# Altium footprint library Derogarian_Library.PcbLib: 94 footprints (part 2 of 6)
Each footprint in its own frame and in the unit in brackets; x right, y up, seen from the top. Pads: shape width x height; smd on the part's side, far side on the other; paste and mask are expansions set on the pad; w line width, h text height; cw(c..) or ccw(c..) is an arc to the next point about the centre after c.
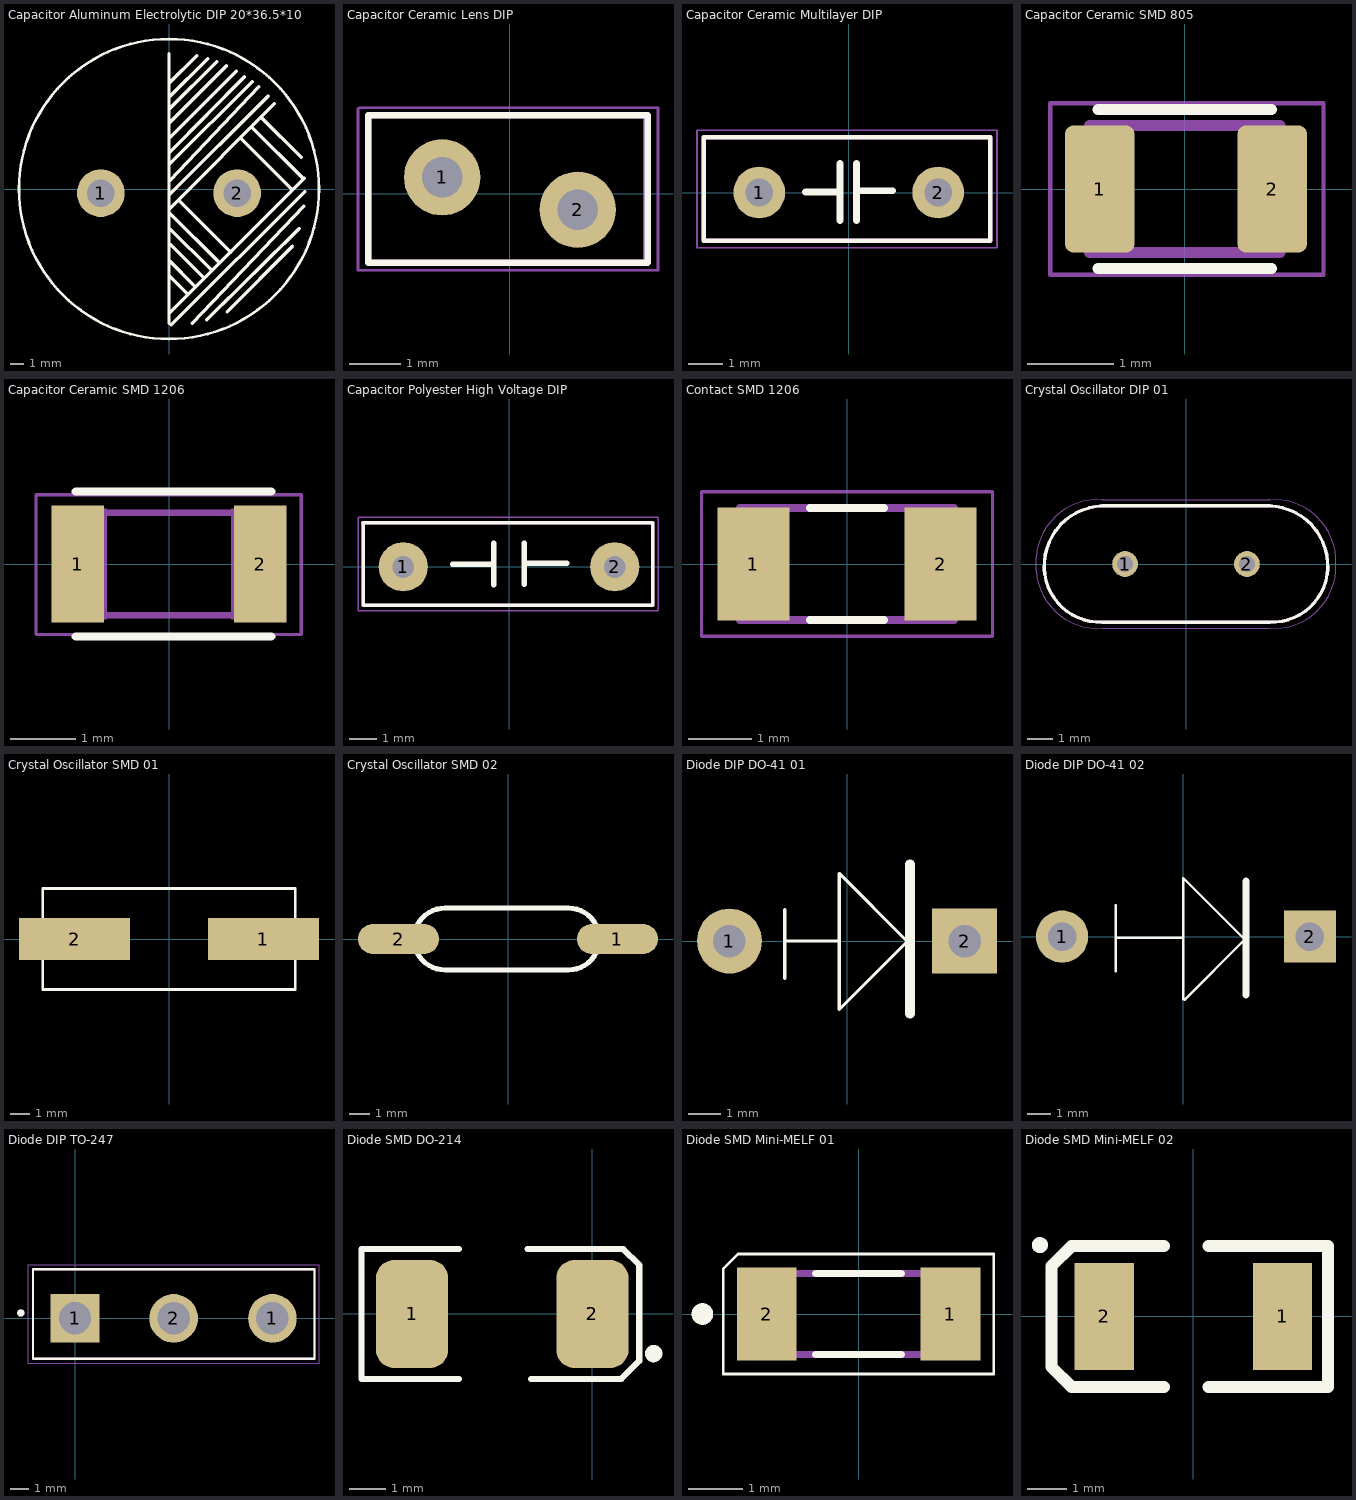
[diagram p1: the footprints below, top view; thin cyan lines are the x and y axes]

## Capacitor Aluminum Electrolytic DIP 20*36.5*10 [mm]
height 12
pads (2):
  round 3.5 hole 2: 1(-5,-0.305) 2(5,-0.305)
Top Overlay:
  circle w0.2: c0,0 r11
  lines w0.25: 0,-5.232 1.858,-7.083 ; 0,4.826 4.216,9.042 ; 0,5.842 3.492,9.335 ; 0,6.731 2.832,9.563 ; 0,7.747 2.032,9.779 ; 0.025,-9.119 9.931,0.787 ; 0.025,-6.375 1.375,-7.719 ; 0.025,-2.87 3.105,-5.937 ; 0.025,-0.432 7.277,6.82 ; 0.025,3.708 4.94,8.623 ; 0.051,-1.778 3.678,-5.391 ; 0.052,0.613 6.581,7.491 ; 0.064,1.841 6.096,7.874 ; 0.063,2.706 5.538,8.229 ; 0.076,-4.064 2.507,-6.485 ; 0.079,-1.425 7.722,6.248 ; 0.165,-9.97 9.944,-0.191 ; 0.813,-0.94 4.516,-4.628 ; 1.716,-9.844 9.881,-1.27 ; 2.763,-9.595 9.55,-2.896 ; 4.267,-9.017 9.059,-4.182 ; 5.258,3.708 9.05,-0.069 ; 6.071,4.521 9.875,0.732 ; 6.807,5.207 9.696,2.33
  lines w0.254: 0,-9.83 0,9.931 ; 0,6.909 0,7.544
3D body "User Library-CAPAER_D200_L350_P100_W010X030.STEP": height 2, standoff -36.01, extent -9.847,-10.33 10.163,9.67

## Capacitor Ceramic Lens DIP [mm]
pads (2):
  round 1.5 hole 0.8: 1(-1.333,0.318) 2(1.333,-0.318)
Top Overlay:
  lines w0.127: -2.787,1.543 -2.787,-1.359 2.706,-1.359 2.706,1.537 -2.781,1.537
Mechanical 13:
  lines w0.127: -2.787,-1.359 2.68,-1.359 2.68,1.537 -2.787,1.537 -2.787,-1.359
Mechanical 15:
  lines w0.05: -2.987,1.664 -2.987,-1.511 2.909,-1.511 2.909,1.69 -2.957,1.688
3D body "User Library-Cer-Cap2 (3_5x1_5).STEP": height 4.5, standoff -2, extent -1.66,-0.853 1.84,0.648

## Capacitor Ceramic Multilayer DIP [mm]
pads (2):
  round 1.5 hole 0.8: 1(-2.594,0) 2(2.594,0)
Top Overlay:
  lines w0.127: -4.198,-1.398 -4.198,1.602 4.094,1.602 ; -4.194,-1.398 4.094,-1.398 ; 4.097,-1.398 4.097,1.602
  lines w0.2: -1.254,0.013 -0.254,0.013 ; -0.254,-0.813 -0.254,0.838 ; 0.229,-0.813 0.229,0.838 ; 0.27,0.051 1.27,0.051
Mechanical 13:
  lines w0.127: 4.094,-1.398 -4.198,-1.398 -4.198,1.596 -4.194,1.6 4.094,1.6 ; 4.097,-1.398 4.097,1.6
Mechanical 15:
  lines w0.05: -4.398,1.802 -4.398,-1.598 4.29,-1.598 ; -4.397,1.802 4.29,1.803 ; 4.297,-1.598 4.297,1.802
3D body "c322c104k5r5ta.stp": height 7.31, standoff -6.29, extent -2.67,-1.51 2.92,1.675

## Capacitor Ceramic SMD 805 [mm]
pads (2):
  rrect25% 0.8x1.47 smd: 1(-0.98,0) 2(1.01,0)
Top Overlay:
  lines w0.127: -1,-0.915 1,-0.915 ; -1,0.915 1,0.915
Mechanical 13:
  lines w0: -0.356,-0.737 0.356,-0.737
  lines w0.127: -1.1,-0.73 1.1,-0.73 1.1,0.73 -1.1,0.73 -1.1,-0.73
Mechanical 15:
  lines w0.05: -1.55,-0.99 1.6,-0.99 1.6,0.99 -1.55,0.99 -1.55,-0.99
3D body "C0805C102K1RACTU.STEP": height 1.23, standoff -0.04, extent -0.94,-0.686 1.092,0.711

## Capacitor Ceramic SMD 1206 [mm]
pads (2):
  rect 0.8x1.8 smd: 1(-1.4,0) 2(1.4,0)
Top Overlay:
  lines w0.127: -1.43,-1.11 1.57,-1.11 ; -1.43,1.11 1.57,1.11
Mechanical 13:
  region: 1.702,-0.849 0.952,-0.849 0.952,0.851 1.702,0.851
  region: -0.952,-0.851 -1.702,-0.851 -1.702,0.849 -0.952,0.849
  lines w0.102: -0.965,-0.787 0.965,-0.787 ; -0.965,0.787 0.965,0.787
Mechanical 15:
  lines w0.051: -2.04,-1.08 -2.04,1.06 2.03,1.06 2.03,-1.08 -2.04,-1.08
3D body "c1206c101j5gactu.stp": height 0.87, standoff -0.01, extent -1.7,-0.9 1.7,0.9

## Capacitor Polyester High Voltage DIP [mm]
pads (2):
  round 1.8 hole 0.8: 1(-3.861,0) 2(3.861,0)
Top Overlay:
  lines w0.127: -5.333,1.602 5.238,1.602 ; -5.315,1.602 -5.315,-1.398 5.238,-1.398 ; 5.241,-1.398 5.241,1.602
  lines w0.2: -2.059,0.102 -0.559,0.102 ; -0.559,-0.648 -0.559,0.852 ; 0.559,-0.636 0.559,0.864 ; 0.608,0.127 2.108,0.127
Mechanical 13:
  lines w0.127: -5.315,-1.398 -5.315,1.596 -5.31,1.6 ; -5.307,-1.398 5.238,-1.398 ; -5.282,1.6 5.238,1.6 ; 5.241,-1.398 5.241,1.6
Mechanical 15:
  lines w0.05: -5.515,-1.598 -5.515,1.802 ; -5.51,-1.598 5.434,-1.598 ; -5.485,1.801 5.434,1.803 ; 5.441,-1.598 5.441,1.802
3D body "User Library-D6x7_5.STEP": height 9, standoff -2, extent -4.049,-1.578 4.051,1.422

## Contact SMD 1206 [mm]
pads (2):
  rect 1.13x1.77 smd: 1(-1.47,0) 2(1.47,0)
Top Overlay:
  lines w0.127: -0.58,-0.88 0.58,-0.88 ; -0.58,0.88 0.58,0.88
Mechanical 13:
  lines w0.127: -1.68,-0.88 1.68,-0.88 1.68,0.88 -1.68,0.88 -1.68,-0.88
Mechanical 15:
  lines w0.05: -2.285,-1.135 2.285,-1.135 2.285,1.135 -2.285,1.135 -2.285,-1.135
3D body "User Library-RESC3216X06N.STEP": height 0.55, standoff 0, extent -1.625,-0.774 1.575,0.826

## Crystal Oscillator DIP 01 [mm]
pads (2):
  round 1.03 hole 0.63: 1(-2.44,0) 2(2.44,0)
Top Overlay:
  lines w0.127: -5.675,-0.169 cw(c-3.26,-0.085) -3.344,2.33 ; -5.675,-0.168 ccw(c-3.435,-0.09) -3.357,-2.33 ; -3.35,-2.33 3.35,-2.33 ; -3.35,2.33 3.35,2.33 ; 3.344,2.33 cw(c3.26,-0.085) 5.675,-0.169 ; 3.357,-2.33 ccw(c3.435,-0.09) 5.675,-0.168
Mechanical 13:
  lines w0.127: -5.675,-0.169 cw(c-3.26,-0.085) -3.344,2.33 ; -5.675,-0.168 ccw(c-3.435,-0.09) -3.357,-2.33 ; -3.35,-2.33 3.35,-2.33 ; -3.35,2.33 3.35,2.33 ; 3.344,2.33 cw(c3.26,-0.085) 5.675,-0.169 ; 3.357,-2.33 ccw(c3.435,-0.09) 5.675,-0.168
Mechanical 15:
  lines w0.05: -5.999,-0.264 ccw(c-3.51,-0.09) -3.336,-2.579 ; -6,-0.25 -6,0.25 ; -5.999,0.264 cw(c-3.51,0.09) -3.336,2.579 ; -3.35,-2.58 3.35,-2.58 ; -3.35,2.58 3.35,2.58 ; 3.336,-2.579 ccw(c3.51,-0.09) 5.999,-0.264 ; 3.336,2.579 cw(c3.51,0.09) 5.999,0.264 ; 6,-0.25 6,0.25
3D body "ECS-80-18-1X.STEP": height 15.46, standoff -10.7, extent -5.75,-2.5 5.6,2.5

## Crystal Oscillator SMD 01 [mil]
pads (2):
  rect 220x83 smd: 1(187,0) 2(-187,0)
Top Overlay:
  lines w5: -250,-100 250,-100 250,100 -250,100 -250,-100
3D body "ABLS-8.000MHZ-B4-T--3DModel-STEP-400430.STEP": height 160, standoff -4, extent -246,-91 254,94

## Crystal Oscillator SMD 02 [mm]
pads (2):
  oval 4x1.5 smd: 1(5.397,0) 2(-5.397,0)
Top Overlay:
  lines w0.254: -3.112,-1.524 cw(c-3.111,0) -3.111,1.524 2.984,1.524 cw(c2.984,0) 2.984,-1.524 -2.603,-1.524 -3.111,-1.524
3D body "User Library-HC49_Crystal_SM.STEP": height 4.5, standoff -0.01, extent -7.053,-2.5 6.848,2.5

## Diode DIP DO-41 01 [mm]
height 2.8
pads (2):
  round 2 hole 1: 1(-3.619,0)
  rect 2x2 hole 1: 2(3.619,0)
Top Overlay:
  lines w0.1: -1.918,-1.143 -1.918,0.965 ; -1.892,0 -0.298,0 ; -0.241,-2.108 1.854,-0.013 -0.241,2.083 -0.241,-2.108
  lines w0.3: 1.943,-2.235 1.943,2.362
3D body "User Library-1N4007 x7mm.STEP": height 3.81, standoff -1.4, extent -3.963,-1.426 3.836,1.194

## Diode DIP DO-41 02 [mm]
height 2.8
pads (2):
  round 2.2 hole 1.2: 1(-5.105,0)
  rect 2.2x2.2 hole 1.2: 2(5.334,0)
Top Overlay:
  lines w0.1: -2.845,-1.473 -2.845,1.321 ; -2.845,-0.051 0,-0.051 ; 0,-2.642 0,2.464 2.591,-0.127 0.051,-2.667
  lines w0.3: 2.642,-2.464 2.642,2.337
3D body "CircuitWorks-DIODE0_4.STEP": height 3.55, standoff -1.54, extent -5.334,-1.397 5.588,1.168

## Diode DIP TO-247 [mm]
pads (3):
  rect 2.69x2.69 hole 1.79: 1(0,0)
  round 2.69 hole 1.79: 1(10.92,0) 2(5.46,0)
Top Overlay:
  circle w0.2: c-3,0.3 r0.1
  lines w0.127: -2.33,-2.235 13.25,-2.235 13.25,2.71 -2.33,2.71 -2.33,-2.235
Mechanical 13:
  circle w0.2: c-3,0.3 r0.1
  lines w0.127: -2.33,-2.235 13.25,-2.235 13.25,2.71 -2.33,2.71 -2.33,-2.235
Mechanical 15:
  lines w0.05: -2.58,-2.485 13.5,-2.485 13.5,2.965 -2.58,2.965 -2.58,-2.485
3D body "step_temp.STEP": height 30.1, standoff -5, extent -2.339,-2.485 13.261,2.515

## Diode SMD DO-214 [mm]
pads (2):
  rrect50% 2x3 smd: 1(-5,0) 2(0,0)
Top Overlay:
  circle w0.24: c1.7,-1.1 r0.12
  lines w0.17: -3.7,-1.8 -6.4,-1.8 -6.4,1.8 -3.7,1.8 ; -1.8,1.8 0.625,1.8 0.863,1.8 1.3,1.363 1.3,-1.1 ; -1.7,-1.8 0.8,-1.8 1.3,-1.3 1.3,-1
3D body "User Library-403A-03_rotated.STEP": height 2.36, standoff 0.05, extent -5.42,-1.68 0.02,1.88

## Diode SMD Mini-MELF 01 [mm]
pads (2):
  rect 1.11x1.73 smd: 1(1.705,0) 2(-1.705,0)
Top Overlay:
  circle w0.2: c-2.9,0 r0.1
  lines w0.05: -2.51,-1.115 2.51,-1.115 2.51,1.115 -2.238,1.115 -2.51,0.843 -2.51,-1.115
  lines w0.127: -0.8,-0.75 0.8,-0.75 ; -0.8,0.75 0.8,0.75
Mechanical 13:
  circle w0.2: c-2.9,0 r0.1
  lines w0.127: -1.75,-0.75 1.75,-0.75 1.75,0.75 -1.75,0.75 -1.75,-0.75
3D body "BZT55B22 L0G.STEP": height 1.6, standoff 0, extent -1.725,-0.775 1.775,0.825

## Diode SMD Mini-MELF 02 [mm]
pads (2):
  rect 1.5x2.7 smd: 1(2.25,0) 2(-2.25,0)
Top Overlay:
  circle w0.2: c-3.879,1.803 r0.1
  lines w0.305: -3.592,1.2 -3.592,-1.27 -3.084,-1.778 -0.75,-1.778 ; -3.592,1.27 -3.084,1.778 -0.75,1.778 ; 0.381,-1.778 3.393,-1.778 3.393,1.778 0.381,1.778
Mechanical 13:
  circle w0.2: c-3.879,1.803 r0.1
3D body "User Library-MELF.STEP": height 2.34, standoff -0.14, extent -2.33,-1.2 2.67,1.3